# Altium footprint library 4.49-接插件.PcbLib: 260 footprints (part 1 of 17)
Each footprint in its own frame and in the unit in brackets; x right, y up, seen from the top. Pads: shape width x height; smd on the part's side, far side on the other; paste and mask are expansions set on the pad; w line width, h text height; cw(c..) or ccw(c..) is an arc to the next point about the centre after c.
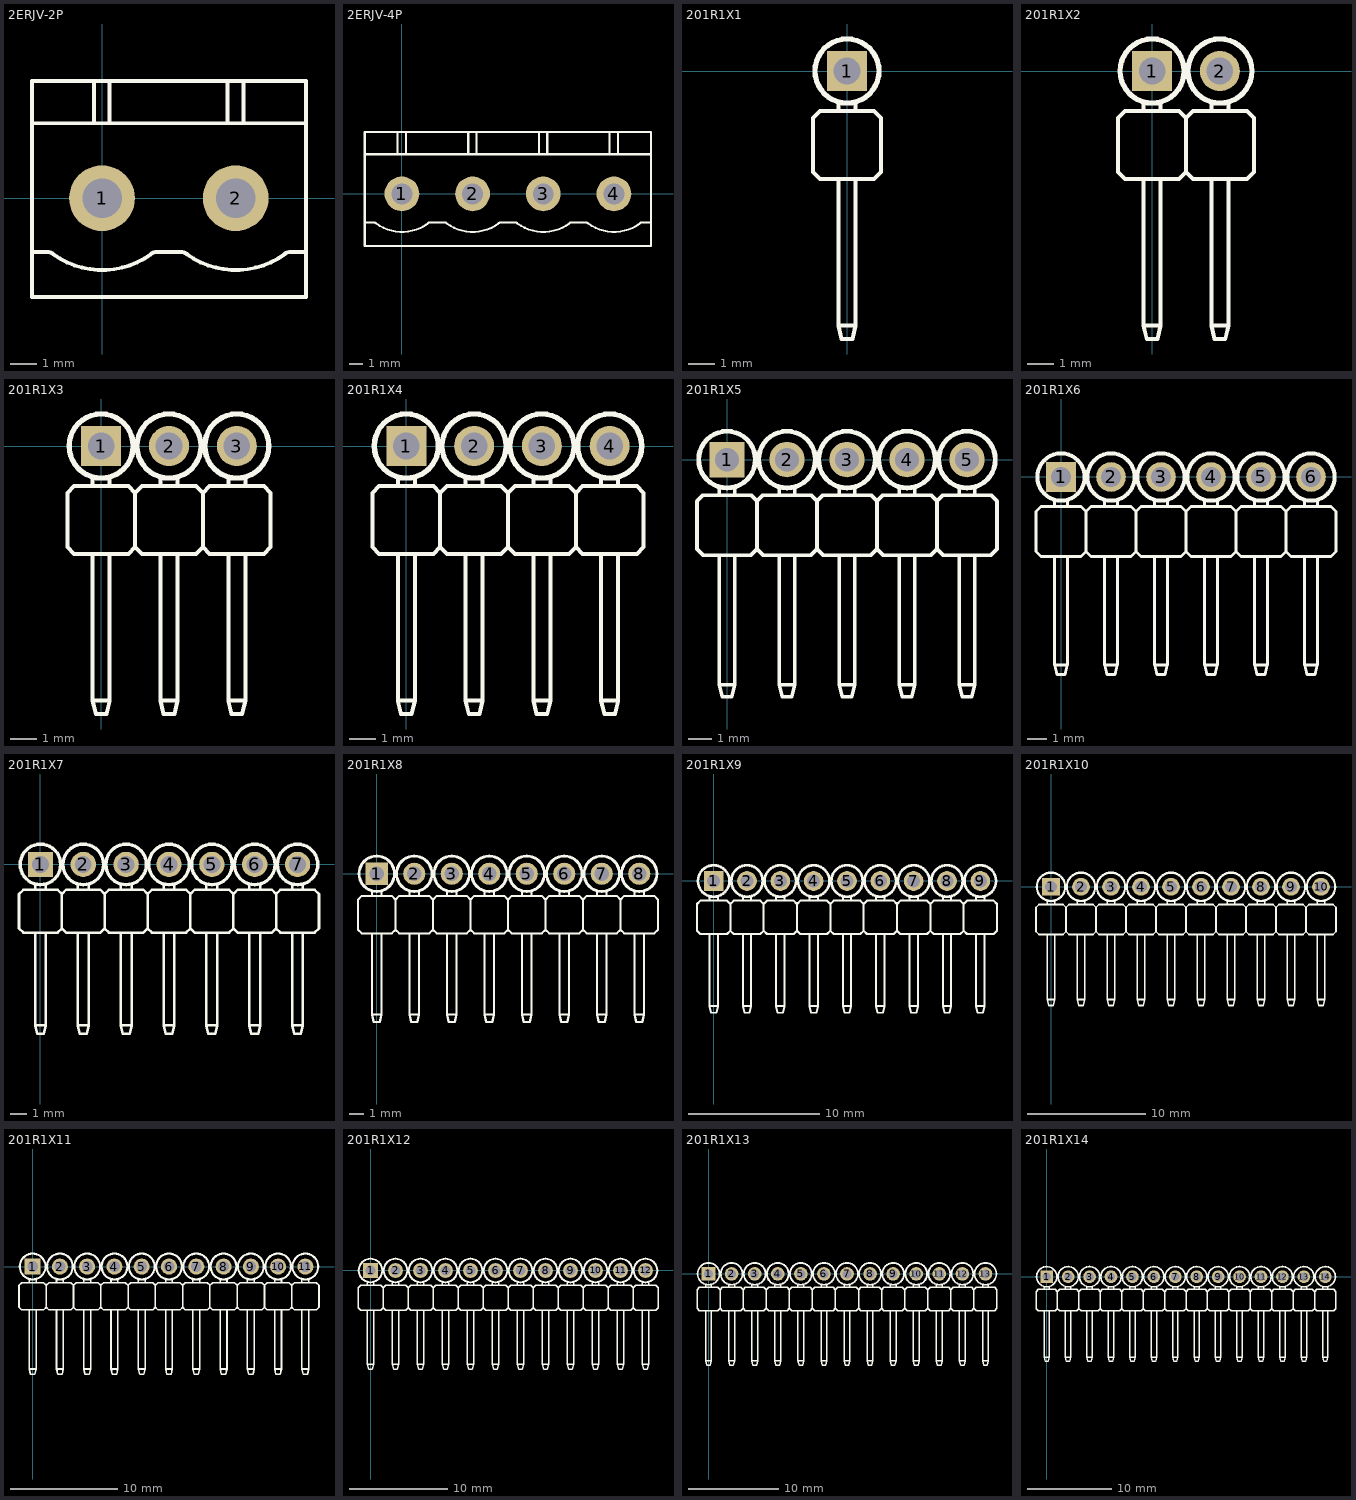
[diagram p0: the footprints below, top view; thin cyan lines are the x and y axes]

## 2ERJV-2P [mm] "淘宝ID:黄晶宝石"
pads (2):
  round 2.5 hole 1.5: 1(0,0) 2(5.08,0)
Top Overlay:
  lines w0.15: -2.67,-2.078 -2.67,-2.05 -2.04,-2.05 cw(c-2.04,-2.308) -1.857,-2.126 ccw(c0.005,0.429) 1.861,-2.131 ; -2.67,2.85 7.75,2.85 ; -0.311,2.85 -0.311,4.45 ; 0.289,2.85 0.289,4.412 ; 1.857,-2.126 cw(c2.04,-2.308) 2.04,-2.05 3.04,-2.05 cw(c3.04,-2.308) 3.223,-2.126 ccw(c5.085,0.429) 6.941,-2.131 ; 4.769,2.85 4.769,4.45 ; 5.369,2.85 5.369,4.412 ; 6.937,-2.126 cw(c7.12,-2.308) 7.12,-2.05 7.745,-2.05 ; -2.67,-3.75 7.75,-3.75 7.75,4.45 -2.67,4.45 -2.67,-3.75
3D body "User Library-konektor sauro 2pm.step": height 12, standoff -4.5, extent -3.015,-3.619 7.485,4.323

## 2ERJV-4P [mm] "淘宝ID:黄晶宝石"
pads (4):
  round 2.5 hole 1.5: 1(0,0) 2(5.08,0) 3(10.16,0) 4(15.24,0)
Top Overlay:
  lines w0.15: -2.67,-2.078 -2.67,-2.05 -2.04,-2.05 cw(c-2.04,-2.308) -1.857,-2.126 ccw(c0.005,0.429) 1.861,-2.131 ; -2.67,2.85 17.91,2.85 ; -0.311,2.85 -0.311,4.45 ; 0.289,2.85 0.289,4.412 ; 1.857,-2.126 cw(c2.04,-2.308) 2.04,-2.05 3.04,-2.05 cw(c3.04,-2.308) 3.223,-2.126 ccw(c5.085,0.429) 6.941,-2.131 ; 4.769,2.85 4.769,4.45 ; 5.369,2.85 5.369,4.412 ; 6.937,-2.126 cw(c7.12,-2.308) 7.12,-2.05 8.12,-2.05 cw(c8.12,-2.308) 8.303,-2.126 ccw(c10.165,0.429) 12.021,-2.131 ; 9.849,2.85 9.849,4.45 ; 10.449,2.85 10.449,4.412 ; 12.017,-2.126 cw(c12.2,-2.308) 12.2,-2.05 13.2,-2.05 cw(c13.2,-2.308) 13.383,-2.126 ccw(c15.245,0.429) 17.101,-2.131 ; 14.929,2.85 14.929,4.45 ; 15.529,2.85 15.529,4.412 ; 17.097,-2.126 cw(c17.28,-2.308) 17.28,-2.05 17.91,-2.05 ; -2.67,-3.75 17.91,-3.75 17.91,4.45 -2.67,4.45 -2.67,-3.75
3D body "User Library-konektor sauro 2pm.step": height 12, standoff -4.5, extent 7.145,-3.619 17.645,4.323
3D body "User Library-konektor sauro 2pm.step": height 12, standoff -4.5, extent -3.015,-3.619 7.485,4.323

## 201R1X1 [mm] "淘宝ID:黄晶宝石"
pads (1):
  rect 1.5x1.5 hole 1: 1(0,0)
Top Overlay:
  circle w0.2: c0,0 r1.2
  lines w0.15: -0.32,-4.05 -0.32,-9.54 ; -0.32,-1.5 -0.32,-1.27 ; 0.32,-4.05 0.32,-9.54 ; 0.32,-1.5 0.32,-1.27 ; -0.32,-9.54 -0.2,-10.04 0.2,-10.04 0.32,-9.54 ; -0.32,-9.54 0.32,-9.54 ; -1.27,-3.786 -1.27,-1.754 -1.016,-1.5 1.016,-1.5 1.27,-1.754 1.27,-3.786 1.016,-4.04 -1.016,-4.04 -1.27,-3.786
3D body "201R1.STEP": height 2.54, standoff -1.73, extent -1.27,-10 1.27,0.315

## 201R1X2 [mm] "淘宝ID:黄晶宝石"
pads (2):
  rect 1.5x1.5 hole 1: 1(0,0)
  round 1.5 hole 1: 2(2.54,0)
Top Overlay:
  circle w0.2: c0,0 r1.2
  circle w0.2: c2.54,0 r1.2
  lines w0.15: -0.32,-4.05 -0.32,-9.54 ; -0.32,-1.5 -0.32,-1.27 ; 0.32,-4.05 0.32,-9.54 ; 0.32,-1.5 0.32,-1.27 ; 2.22,-4.05 2.22,-9.54 ; 2.22,-1.5 2.22,-1.27 ; 2.86,-4.05 2.86,-9.54 ; 2.86,-1.5 2.86,-1.27 ; -0.32,-9.54 0.32,-9.54 ; -0.32,-9.54 -0.2,-10.04 0.2,-10.04 0.32,-9.54 ; 1.27,-3.786 1.016,-4.04 -1.016,-4.04 -1.27,-3.786 -1.27,-1.754 -1.016,-1.5 1.016,-1.5 1.27,-1.754 ; 1.27,-3.786 1.27,-1.754 ; 1.27,-3.786 1.524,-4.04 3.556,-4.04 3.81,-3.786 3.81,-1.754 3.556,-1.5 1.524,-1.5 1.27,-1.754 ; 2.22,-9.54 2.34,-10.04 2.74,-10.04 2.86,-9.54 ; 2.22,-9.54 2.86,-9.54
3D body "201R2.STEP": height 2.54, standoff -1.73, extent -1.27,-10 3.81,0.315

## 201R1X3 [mm] "淘宝ID:黄晶宝石"
pads (3):
  rect 1.5x1.5 hole 1: 1(0,0)
  round 1.5 hole 1: 2(2.54,0) 3(5.08,0)
Top Overlay:
  circle w0.2: c5.08,0 r1.2
  circle w0.2: c0,0 r1.2
  circle w0.2: c2.54,0 r1.2
  lines w0.15: -0.32,-4.05 -0.32,-9.54 ; -0.32,-1.5 -0.32,-1.27 ; 0.32,-4.05 0.32,-9.54 ; 0.32,-1.5 0.32,-1.27 ; 2.22,-4.05 2.22,-9.54 ; 2.22,-1.5 2.22,-1.27 ; 2.86,-4.05 2.86,-9.54 ; 2.86,-1.5 2.86,-1.27 ; 4.76,-4.05 4.76,-9.54 ; 4.76,-1.5 4.76,-1.27 ; 5.4,-4.05 5.4,-9.54 ; 5.4,-1.5 5.4,-1.27 ; -0.32,-9.54 0.32,-9.54 ; -0.32,-9.54 -0.2,-10.04 0.2,-10.04 0.32,-9.54 ; 1.27,-3.786 1.27,-1.754 ; 1.27,-3.786 1.016,-4.04 -1.016,-4.04 -1.27,-3.786 -1.27,-1.754 -1.016,-1.5 1.016,-1.5 1.27,-1.754 ; 1.27,-3.786 1.524,-4.04 3.556,-4.04 3.81,-3.786 ; 1.27,-1.754 1.524,-1.5 3.556,-1.5 3.81,-1.754 ; 2.22,-9.54 2.34,-10.04 2.74,-10.04 2.86,-9.54 ; 2.22,-9.54 2.86,-9.54 ; 3.81,-3.786 3.81,-1.754 ; 3.81,-3.786 4.064,-4.04 6.096,-4.04 6.35,-3.786 6.35,-1.754 6.096,-1.5 4.064,-1.5 3.81,-1.754 ; 4.76,-9.54 5.4,-9.54 ; 4.76,-9.54 4.88,-10.04 5.28,-10.04 5.4,-9.54
3D body "201R3.STEP": height 2.54, standoff -1.73, extent -1.27,-10 6.35,0.315

## 201R1X4 [mm] "淘宝ID:黄晶宝石"
pads (4):
  rect 1.5x1.5 hole 1: 1(0,0)
  round 1.5 hole 1: 2(2.54,0) 3(5.08,0) 4(7.62,0)
Top Overlay:
  circle w0.2: c7.62,0 r1.2
  circle w0.2: c2.54,0 r1.2
  circle w0.2: c0,0 r1.2
  circle w0.2: c5.08,0 r1.2
  lines w0.15: -0.32,-4.05 -0.32,-9.54 ; -0.32,-1.5 -0.32,-1.27 ; 0.32,-4.05 0.32,-9.54 ; 0.32,-1.5 0.32,-1.27 ; 2.22,-4.05 2.22,-9.54 ; 2.22,-1.5 2.22,-1.27 ; 2.86,-4.05 2.86,-9.54 ; 2.86,-1.5 2.86,-1.27 ; 4.76,-4.05 4.76,-9.54 ; 4.76,-1.5 4.76,-1.27 ; 5.4,-4.05 5.4,-9.54 ; 5.4,-1.5 5.4,-1.27 ; 7.3,-4.05 7.3,-9.54 ; 7.3,-1.5 7.3,-1.27 ; 7.94,-4.05 7.94,-9.54 ; 7.94,-1.5 7.94,-1.27 ; -0.32,-9.54 -0.2,-10.04 0.2,-10.04 0.32,-9.54 ; -0.32,-9.54 0.32,-9.54 ; 1.27,-3.786 1.524,-4.04 3.556,-4.04 3.81,-3.786 ; 1.27,-3.786 1.27,-1.754 ; 1.27,-3.786 1.016,-4.04 -1.016,-4.04 -1.27,-3.786 -1.27,-1.754 -1.016,-1.5 1.016,-1.5 1.27,-1.754 ; 1.27,-1.754 1.524,-1.5 3.556,-1.5 3.81,-1.754 ; 2.22,-9.54 2.86,-9.54 ; 2.22,-9.54 2.34,-10.04 2.74,-10.04 2.86,-9.54 ; 3.81,-3.786 3.81,-1.754 ; 3.81,-3.786 4.064,-4.04 6.096,-4.04 6.35,-3.786 ; 3.81,-1.754 4.064,-1.5 6.096,-1.5 6.35,-1.754 ; 4.76,-9.54 4.88,-10.04 5.28,-10.04 5.4,-9.54 ; 4.76,-9.54 5.4,-9.54 ; 6.35,-3.786 6.604,-4.04 8.636,-4.04 8.89,-3.786 8.89,-1.754 8.636,-1.5 6.604,-1.5 6.35,-1.754 ; 6.35,-3.786 6.35,-1.754 ; 7.3,-9.54 7.94,-9.54 ; 7.3,-9.54 7.42,-10.04 7.82,-10.04 7.94,-9.54
3D body "201R4.STEP": height 2.54, standoff -1.73, extent -1.27,-10 8.89,0.315

## 201R1X5 [mm] "淘宝ID:黄晶宝石"
pads (5):
  rect 1.5x1.5 hole 1: 1(0,0)
  round 1.5 hole 1: 2(2.54,0) 3(5.08,0) 4(7.62,0) 5(10.16,0)
Top Overlay:
  circle w0.2: c7.62,0 r1.2
  circle w0.2: c2.54,0 r1.2
  circle w0.2: c0,0 r1.2
  circle w0.2: c5.08,0 r1.2
  circle w0.2: c10.16,0 r1.2
  lines w0.15: -0.32,-4.05 -0.32,-9.54 ; -0.32,-1.5 -0.32,-1.27 ; 0.32,-4.05 0.32,-9.54 ; 0.32,-1.5 0.32,-1.27 ; 2.22,-4.05 2.22,-9.54 ; 2.22,-1.5 2.22,-1.27 ; 2.86,-4.05 2.86,-9.54 ; 2.86,-1.5 2.86,-1.27 ; 4.76,-4.05 4.76,-9.54 ; 4.76,-1.5 4.76,-1.27 ; 5.4,-4.05 5.4,-9.54 ; 5.4,-1.5 5.4,-1.27 ; 7.3,-4.05 7.3,-9.54 ; 7.3,-1.5 7.3,-1.27 ; 7.94,-4.05 7.94,-9.54 ; 7.94,-1.5 7.94,-1.27 ; 9.84,-4.05 9.84,-9.54 ; 9.84,-1.5 9.84,-1.27 ; 10.48,-4.05 10.48,-9.54 ; 10.48,-1.5 10.48,-1.27 ; -0.32,-9.54 -0.2,-10.04 0.2,-10.04 0.32,-9.54 ; -0.32,-9.54 0.32,-9.54 ; 1.27,-3.786 1.524,-4.04 3.556,-4.04 3.81,-3.786 ; 1.27,-3.786 1.27,-1.754 ; 1.27,-3.786 1.016,-4.04 -1.016,-4.04 -1.27,-3.786 -1.27,-1.754 -1.016,-1.5 1.016,-1.5 1.27,-1.754 ; 1.27,-1.754 1.524,-1.5 3.556,-1.5 3.81,-1.754 ; 2.22,-9.54 2.86,-9.54 ; 2.22,-9.54 2.34,-10.04 2.74,-10.04 2.86,-9.54 ; 3.81,-3.786 3.81,-1.754 ; 3.81,-3.786 4.064,-4.04 6.096,-4.04 6.35,-3.786 ; 3.81,-1.754 4.064,-1.5 6.096,-1.5 6.35,-1.754 ; 4.76,-9.54 4.88,-10.04 5.28,-10.04 5.4,-9.54 ; 4.76,-9.54 5.4,-9.54 ; 6.35,-3.786 6.604,-4.04 8.636,-4.04 8.89,-3.786 ; 6.35,-3.786 6.35,-1.754 ; 6.35,-1.754 6.604,-1.5 8.636,-1.5 8.89,-1.754 ; 7.3,-9.54 7.94,-9.54 ; 7.3,-9.54 7.42,-10.04 7.82,-10.04 7.94,-9.54 ; 8.89,-3.786 8.89,-1.754 ; 8.89,-3.786 9.144,-4.04 11.176,-4.04 11.43,-3.786 11.43,-1.754 11.176,-1.5 9.144,-1.5 8.89,-1.754 ; 9.84,-9.54 9.96,-10.04 10.36,-10.04 10.48,-9.54 ; 9.84,-9.54 10.48,-9.54
3D body "201R5.STEP": height 2.54, standoff -1.73, extent -1.27,-10 11.43,0.315

## 201R1X6 [mm] "淘宝ID:黄晶宝石"
pads (6):
  rect 1.5x1.5 hole 1: 1(0,0)
  round 1.5 hole 1: 2(2.54,0) 3(5.08,0) 4(7.62,0) 5(10.16,0) 6(12.7,0)
Top Overlay:
  circle w0.2: c12.7,0 r1.2
  circle w0.2: c10.16,0 r1.2
  circle w0.2: c5.08,0 r1.2
  circle w0.2: c0,0 r1.2
  circle w0.2: c2.54,0 r1.2
  circle w0.2: c7.62,0 r1.2
  lines w0.15: -0.32,-4.05 -0.32,-9.54 ; -0.32,-1.5 -0.32,-1.27 ; 0.32,-4.05 0.32,-9.54 ; 0.32,-1.5 0.32,-1.27 ; 2.22,-4.05 2.22,-9.54 ; 2.22,-1.5 2.22,-1.27 ; 2.86,-4.05 2.86,-9.54 ; 2.86,-1.5 2.86,-1.27 ; 4.76,-4.05 4.76,-9.54 ; 4.76,-1.5 4.76,-1.27 ; 5.4,-4.05 5.4,-9.54 ; 5.4,-1.5 5.4,-1.27 ; 7.3,-4.05 7.3,-9.54 ; 7.3,-1.5 7.3,-1.27 ; 7.94,-4.05 7.94,-9.54 ; 7.94,-1.5 7.94,-1.27 ; 9.84,-4.05 9.84,-9.54 ; 9.84,-1.5 9.84,-1.27 ; 10.48,-4.05 10.48,-9.54 ; 10.48,-1.5 10.48,-1.27 ; 12.38,-4.05 12.38,-9.54 ; 12.38,-1.5 12.38,-1.27 ; 13.02,-4.05 13.02,-9.54 ; 13.02,-1.5 13.02,-1.27 ; -0.32,-9.54 0.32,-9.54 ; -0.32,-9.54 -0.2,-10.04 0.2,-10.04 0.32,-9.54 ; 1.27,-3.786 1.016,-4.04 -1.016,-4.04 -1.27,-3.786 -1.27,-1.754 -1.016,-1.5 1.016,-1.5 1.27,-1.754 ; 1.27,-3.786 1.27,-1.754 ; 1.27,-3.786 1.524,-4.04 3.556,-4.04 3.81,-3.786 ; 1.27,-1.754 1.524,-1.5 3.556,-1.5 3.81,-1.754 ; 2.22,-9.54 2.34,-10.04 2.74,-10.04 2.86,-9.54 ; 2.22,-9.54 2.86,-9.54 ; 3.81,-3.786 4.064,-4.04 6.096,-4.04 6.35,-3.786 ; 3.81,-3.786 3.81,-1.754 ; 3.81,-1.754 4.064,-1.5 6.096,-1.5 6.35,-1.754 ; 4.76,-9.54 5.4,-9.54 ; 4.76,-9.54 4.88,-10.04 5.28,-10.04 5.4,-9.54 ; 6.35,-3.786 6.35,-1.754 ; 6.35,-3.786 6.604,-4.04 8.636,-4.04 8.89,-3.786 ; 6.35,-1.754 6.604,-1.5 8.636,-1.5 8.89,-1.754 ; 7.3,-9.54 7.42,-10.04 7.82,-10.04 7.94,-9.54 ; 7.3,-9.54 7.94,-9.54 ; 8.89,-3.786 9.144,-4.04 11.176,-4.04 11.43,-3.786 ; 8.89,-3.786 8.89,-1.754 ; 8.89,-1.754 9.144,-1.5 11.176,-1.5 11.43,-1.754 ; 9.84,-9.54 10.48,-9.54 ; 9.84,-9.54 9.96,-10.04 10.36,-10.04 10.48,-9.54 ; 11.43,-3.786 11.43,-1.754 ; 11.43,-3.786 11.684,-4.04 13.716,-4.04 13.97,-3.786 13.97,-1.754 13.716,-1.5 11.684,-1.5 11.43,-1.754 ; 12.38,-9.54 12.5,-10.04 12.9,-10.04 13.02,-9.54 ; 12.38,-9.54 13.02,-9.54
3D body "201R6.STEP": height 2.54, standoff -1.73, extent -1.27,-10 13.97,0.315

## 201R1X7 [mm] "淘宝ID:黄晶宝石"
pads (7):
  rect 1.5x1.5 hole 1: 1(0,0)
  round 1.5 hole 1: 2(2.54,0) 3(5.08,0) 4(7.62,0) 5(10.16,0) 6(12.7,0) 7(15.24,0)
Top Overlay:
  circle w0.2: c15.24,0 r1.2
  circle w0.2: c12.7,0 r1.2
  circle w0.2: c10.16,0 r1.2
  circle w0.2: c5.08,0 r1.2
  circle w0.2: c0,0 r1.2
  circle w0.2: c2.54,0 r1.2
  circle w0.2: c7.62,0 r1.2
  lines w0.15: -0.32,-4.05 -0.32,-9.54 ; -0.32,-1.5 -0.32,-1.27 ; 0.32,-4.05 0.32,-9.54 ; 0.32,-1.5 0.32,-1.27 ; 2.22,-4.05 2.22,-9.54 ; 2.22,-1.5 2.22,-1.27 ; 2.86,-4.05 2.86,-9.54 ; 2.86,-1.5 2.86,-1.27 ; 4.76,-4.05 4.76,-9.54 ; 4.76,-1.5 4.76,-1.27 ; 5.4,-4.05 5.4,-9.54 ; 5.4,-1.5 5.4,-1.27 ; 7.3,-4.05 7.3,-9.54 ; 7.3,-1.5 7.3,-1.27 ; 7.94,-4.05 7.94,-9.54 ; 7.94,-1.5 7.94,-1.27 ; 9.84,-4.05 9.84,-9.54 ; 9.84,-1.5 9.84,-1.27 ; 10.48,-4.05 10.48,-9.54 ; 10.48,-1.5 10.48,-1.27 ; 12.38,-4.05 12.38,-9.54 ; 12.38,-1.5 12.38,-1.27 ; 13.02,-4.05 13.02,-9.54 ; 13.02,-1.5 13.02,-1.27 ; 14.92,-4.05 14.92,-9.54 ; 14.92,-1.5 14.92,-1.27 ; 15.56,-4.05 15.56,-9.54 ; 15.56,-1.5 15.56,-1.27 ; -0.32,-9.54 0.32,-9.54 ; -0.32,-9.54 -0.2,-10.04 0.2,-10.04 0.32,-9.54 ; 1.27,-3.786 1.27,-1.754 ; 1.27,-3.786 1.016,-4.04 -1.016,-4.04 -1.27,-3.786 -1.27,-1.754 -1.016,-1.5 1.016,-1.5 1.27,-1.754 ; 1.27,-3.786 1.524,-4.04 3.556,-4.04 3.81,-3.786 ; 1.27,-1.754 1.524,-1.5 3.556,-1.5 3.81,-1.754 ; 2.22,-9.54 2.34,-10.04 2.74,-10.04 2.86,-9.54 ; 2.22,-9.54 2.86,-9.54 ; 3.81,-3.786 3.81,-1.754 ; 3.81,-3.786 4.064,-4.04 6.096,-4.04 6.35,-3.786 ; 3.81,-1.754 4.064,-1.5 6.096,-1.5 6.35,-1.754 ; 4.76,-9.54 5.4,-9.54 ; 4.76,-9.54 4.88,-10.04 5.28,-10.04 5.4,-9.54 ; 6.35,-3.786 6.35,-1.754 ; 6.35,-3.786 6.604,-4.04 8.636,-4.04 8.89,-3.786 ; 6.35,-1.754 6.604,-1.5 8.636,-1.5 8.89,-1.754 ; 7.3,-9.54 7.42,-10.04 7.82,-10.04 7.94,-9.54 ; 7.3,-9.54 7.94,-9.54 ; 8.89,-3.786 8.89,-1.754 ; 8.89,-3.786 9.144,-4.04 11.176,-4.04 11.43,-3.786 ; 8.89,-1.754 9.144,-1.5 11.176,-1.5 11.43,-1.754 ; 9.84,-9.54 10.48,-9.54 ; 9.84,-9.54 9.96,-10.04 10.36,-10.04 10.48,-9.54 ; 11.43,-3.786 11.43,-1.754 ; 11.43,-3.786 11.684,-4.04 13.716,-4.04 13.97,-3.786 ; 11.43,-1.754 11.684,-1.5 13.716,-1.5 13.97,-1.754 ; 12.38,-9.54 12.5,-10.04 12.9,-10.04 13.02,-9.54 ; 12.38,-9.54 13.02,-9.54 ; 13.97,-3.786 13.97,-1.754 ; 13.97,-3.786 14.224,-4.04 16.256,-4.04 16.51,-3.786 16.51,-1.754 16.256,-1.5 14.224,-1.5 13.97,-1.754 ; 14.92,-9.54 15.56,-9.54 ; 14.92,-9.54 15.04,-10.04 15.44,-10.04 15.56,-9.54
3D body "201R7.STEP": height 2.54, standoff -1.73, extent -1.27,-10 16.51,0.315

## 201R1X8 [mm] "淘宝ID:黄晶宝石"
pads (8):
  rect 1.5x1.5 hole 1: 1(0,0)
  round 1.5 hole 1: 2(2.54,0) 3(5.08,0) 4(7.62,0) 5(10.16,0) 6(12.7,0) 7(15.24,0) 8(17.78,0)
Top Overlay:
  circle w0.2: c15.24,0 r1.2
  circle w0.2: c12.7,0 r1.2
  circle w0.2: c10.16,0 r1.2
  circle w0.2: c5.08,0 r1.2
  circle w0.2: c0,0 r1.2
  circle w0.2: c2.54,0 r1.2
  circle w0.2: c7.62,0 r1.2
  circle w0.2: c17.78,0 r1.2
  lines w0.15: -0.32,-4.05 -0.32,-9.54 ; -0.32,-1.5 -0.32,-1.27 ; 0.32,-4.05 0.32,-9.54 ; 0.32,-1.5 0.32,-1.27 ; 2.22,-4.05 2.22,-9.54 ; 2.22,-1.5 2.22,-1.27 ; 2.86,-4.05 2.86,-9.54 ; 2.86,-1.5 2.86,-1.27 ; 4.76,-4.05 4.76,-9.54 ; 4.76,-1.5 4.76,-1.27 ; 5.4,-4.05 5.4,-9.54 ; 5.4,-1.5 5.4,-1.27 ; 7.3,-4.05 7.3,-9.54 ; 7.3,-1.5 7.3,-1.27 ; 7.94,-4.05 7.94,-9.54 ; 7.94,-1.5 7.94,-1.27 ; 9.84,-4.05 9.84,-9.54 ; 9.84,-1.5 9.84,-1.27 ; 10.48,-4.05 10.48,-9.54 ; 10.48,-1.5 10.48,-1.27 ; 12.38,-4.05 12.38,-9.54 ; 12.38,-1.5 12.38,-1.27 ; 13.02,-4.05 13.02,-9.54 ; 13.02,-1.5 13.02,-1.27 ; 14.92,-4.05 14.92,-9.54 ; 14.92,-1.5 14.92,-1.27 ; 15.56,-4.05 15.56,-9.54 ; 15.56,-1.5 15.56,-1.27 ; 17.46,-4.05 17.46,-9.54 ; 17.46,-1.5 17.46,-1.27 ; 18.1,-4.05 18.1,-9.54 ; 18.1,-1.5 18.1,-1.27 ; -0.32,-9.54 0.32,-9.54 ; -0.32,-9.54 -0.2,-10.04 0.2,-10.04 0.32,-9.54 ; 1.27,-3.786 1.27,-1.754 ; 1.27,-3.786 1.016,-4.04 -1.016,-4.04 -1.27,-3.786 -1.27,-1.754 -1.016,-1.5 1.016,-1.5 1.27,-1.754 ; 1.27,-3.786 1.524,-4.04 3.556,-4.04 3.81,-3.786 ; 1.27,-1.754 1.524,-1.5 3.556,-1.5 3.81,-1.754 ; 2.22,-9.54 2.34,-10.04 2.74,-10.04 2.86,-9.54 ; 2.22,-9.54 2.86,-9.54 ; 3.81,-3.786 3.81,-1.754 ; 3.81,-3.786 4.064,-4.04 6.096,-4.04 6.35,-3.786 ; 3.81,-1.754 4.064,-1.5 6.096,-1.5 6.35,-1.754 ; 4.76,-9.54 5.4,-9.54 ; 4.76,-9.54 4.88,-10.04 5.28,-10.04 5.4,-9.54 ; 6.35,-3.786 6.35,-1.754 ; 6.35,-3.786 6.604,-4.04 8.636,-4.04 8.89,-3.786 ; 6.35,-1.754 6.604,-1.5 8.636,-1.5 8.89,-1.754 ; 7.3,-9.54 7.42,-10.04 7.82,-10.04 7.94,-9.54 ; 7.3,-9.54 7.94,-9.54 ; 8.89,-3.786 8.89,-1.754 ; 8.89,-3.786 9.144,-4.04 11.176,-4.04 11.43,-3.786 ; 8.89,-1.754 9.144,-1.5 11.176,-1.5 11.43,-1.754 ; 9.84,-9.54 10.48,-9.54 ; 9.84,-9.54 9.96,-10.04 10.36,-10.04 10.48,-9.54 ; 11.43,-3.786 11.43,-1.754 ; 11.43,-3.786 11.684,-4.04 13.716,-4.04 13.97,-3.786 ; 11.43,-1.754 11.684,-1.5 13.716,-1.5 13.97,-1.754 ; 12.38,-9.54 12.5,-10.04 12.9,-10.04 13.02,-9.54 ; 12.38,-9.54 13.02,-9.54 ; 13.97,-3.786 13.97,-1.754 ; 13.97,-3.786 14.224,-4.04 16.256,-4.04 16.51,-3.786 ; 13.97,-1.754 14.224,-1.5 16.256,-1.5 16.51,-1.754 ; 14.92,-9.54 15.56,-9.54 ; 14.92,-9.54 15.04,-10.04 15.44,-10.04 15.56,-9.54 ; 16.51,-3.786 16.764,-4.04 18.796,-4.04 19.05,-3.786 19.05,-1.754 18.796,-1.5 16.764,-1.5 16.51,-1.754 ; 16.51,-3.786 16.51,-1.754 ; 17.46,-9.54 17.58,-10.04 17.98,-10.04 18.1,-9.54 ; 17.46,-9.54 18.1,-9.54
3D body "201R8.STEP": height 2.54, standoff -1.73, extent -1.27,-10 19.05,0.315

## 201R1X9 [mm] "淘宝ID:黄晶宝石"
pads (9):
  rect 1.5x1.5 hole 1: 1(0,0)
  round 1.5 hole 1: 2(2.54,0) 3(5.08,0) 4(7.62,0) 5(10.16,0) 6(12.7,0) 7(15.24,0) 8(17.78,0) 9(20.32,0)
Top Overlay:
  circle w0.2: c15.24,0 r1.2
  circle w0.2: c12.7,0 r1.2
  circle w0.2: c10.16,0 r1.2
  circle w0.2: c5.08,0 r1.2
  circle w0.2: c0,0 r1.2
  circle w0.2: c2.54,0 r1.2
  circle w0.2: c7.62,0 r1.2
  circle w0.2: c17.78,0 r1.2
  circle w0.2: c20.32,0 r1.2
  lines w0.15: -0.32,-4.05 -0.32,-9.54 ; -0.32,-1.5 -0.32,-1.27 ; 0.32,-4.05 0.32,-9.54 ; 0.32,-1.5 0.32,-1.27 ; 2.22,-4.05 2.22,-9.54 ; 2.22,-1.5 2.22,-1.27 ; 2.86,-4.05 2.86,-9.54 ; 2.86,-1.5 2.86,-1.27 ; 4.76,-4.05 4.76,-9.54 ; 4.76,-1.5 4.76,-1.27 ; 5.4,-4.05 5.4,-9.54 ; 5.4,-1.5 5.4,-1.27 ; 7.3,-4.05 7.3,-9.54 ; 7.3,-1.5 7.3,-1.27 ; 7.94,-4.05 7.94,-9.54 ; 7.94,-1.5 7.94,-1.27 ; 9.84,-4.05 9.84,-9.54 ; 9.84,-1.5 9.84,-1.27 ; 10.48,-4.05 10.48,-9.54 ; 10.48,-1.5 10.48,-1.27 ; 12.38,-4.05 12.38,-9.54 ; 12.38,-1.5 12.38,-1.27 ; 13.02,-4.05 13.02,-9.54 ; 13.02,-1.5 13.02,-1.27 ; 14.92,-4.05 14.92,-9.54 ; 14.92,-1.5 14.92,-1.27 ; 15.56,-4.05 15.56,-9.54 ; 15.56,-1.5 15.56,-1.27 ; 17.46,-4.05 17.46,-9.54 ; 17.46,-1.5 17.46,-1.27 ; 18.1,-4.05 18.1,-9.54 ; 18.1,-1.5 18.1,-1.27 ; 20,-4.05 20,-9.54 ; 20,-1.5 20,-1.27 ; 20.64,-4.05 20.64,-9.54 ; 20.64,-1.5 20.64,-1.27 ; -0.32,-9.54 0.32,-9.54 ; -0.32,-9.54 -0.2,-10.04 0.2,-10.04 0.32,-9.54 ; 1.27,-3.786 1.27,-1.754 ; 1.27,-3.786 1.016,-4.04 -1.016,-4.04 -1.27,-3.786 -1.27,-1.754 -1.016,-1.5 1.016,-1.5 1.27,-1.754 ; 1.27,-3.786 1.524,-4.04 3.556,-4.04 3.81,-3.786 ; 1.27,-1.754 1.524,-1.5 3.556,-1.5 3.81,-1.754 ; 2.22,-9.54 2.34,-10.04 2.74,-10.04 2.86,-9.54 ; 2.22,-9.54 2.86,-9.54 ; 3.81,-3.786 3.81,-1.754 ; 3.81,-3.786 4.064,-4.04 6.096,-4.04 6.35,-3.786 ; 3.81,-1.754 4.064,-1.5 6.096,-1.5 6.35,-1.754 ; 4.76,-9.54 5.4,-9.54 ; 4.76,-9.54 4.88,-10.04 5.28,-10.04 5.4,-9.54 ; 6.35,-3.786 6.35,-1.754 ; 6.35,-3.786 6.604,-4.04 8.636,-4.04 8.89,-3.786 ; 6.35,-1.754 6.604,-1.5 8.636,-1.5 8.89,-1.754 ; 7.3,-9.54 7.42,-10.04 7.82,-10.04 7.94,-9.54 ; 7.3,-9.54 7.94,-9.54 ; 8.89,-3.786 8.89,-1.754 ; 8.89,-3.786 9.144,-4.04 11.176,-4.04 11.43,-3.786 ; 8.89,-1.754 9.144,-1.5 11.176,-1.5 11.43,-1.754 ; 9.84,-9.54 10.48,-9.54 ; 9.84,-9.54 9.96,-10.04 10.36,-10.04 10.48,-9.54 ; 11.43,-3.786 11.43,-1.754 ; 11.43,-3.786 11.684,-4.04 13.716,-4.04 13.97,-3.786 ; 11.43,-1.754 11.684,-1.5 13.716,-1.5 13.97,-1.754 ; 12.38,-9.54 12.5,-10.04 12.9,-10.04 13.02,-9.54 ; 12.38,-9.54 13.02,-9.54 ; 13.97,-3.786 13.97,-1.754 ; 13.97,-3.786 14.224,-4.04 16.256,-4.04 16.51,-3.786 ; 13.97,-1.754 14.224,-1.5 16.256,-1.5 16.51,-1.754 ; 14.92,-9.54 15.56,-9.54 ; 14.92,-9.54 15.04,-10.04 15.44,-10.04 15.56,-9.54 ; 16.51,-3.786 16.764,-4.04 18.796,-4.04 19.05,-3.786 ; 16.51,-3.786 16.51,-1.754 ; 16.51,-1.754 16.764,-1.5 18.796,-1.5 19.05,-1.754 ; 17.46,-9.54 17.58,-10.04 17.98,-10.04 18.1,-9.54 ; 17.46,-9.54 18.1,-9.54 ; 19.05,-3.786 19.05,-1.754 ; 19.05,-3.786 19.304,-4.04 21.336,-4.04 21.59,-3.786 21.59,-1.754 21.336,-1.5 19.304,-1.5 19.05,-1.754 ; 20,-9.54 20.64,-9.54 ; 20,-9.54 20.12,-10.04 20.52,-10.04 20.64,-9.54
3D body "201R9.STEP": height 2.54, standoff -1.73, extent -1.27,-10 21.59,0.315

## 201R1X10 [mm] "淘宝ID:黄晶宝石"
pads (10):
  rect 1.5x1.5 hole 1: 1(0,0)
  round 1.5 hole 1: 2(2.54,0) 3(5.08,0) 4(7.62,0) 5(10.16,0) 6(12.7,0) 7(15.24,0) 8(17.78,0) 9(20.32,0) 10(22.86,0)
Top Overlay:
  drawing of 161 lines, arcs and shapes, not listed
3D body "201R10.STEP": height 2.54, standoff -1.73, extent -1.27,-10 24.13,0.315

## 201R1X11 [mm]
pads (11):
  rect 1.5x1.5 hole 1: 1(0,0)
  round 1.5 hole 1: 2(2.54,0) 3(5.08,0) 4(7.62,0) 5(10.16,0) 6(12.7,0) 7(15.24,0) 8(17.78,0) 9(20.32,0) 10(22.86,0) 11(25.4,0)
Top Overlay:
  drawing of 177 lines, arcs and shapes, not listed
3D body "201R11.STEP": height 2.54, standoff -1.73, extent -1.27,-10 26.67,0.315

## 201R1X12 [mm]
pads (12):
  rect 1.5x1.5 hole 1: 1(0,0)
  round 1.5 hole 1: 2(2.54,0) 3(5.08,0) 4(7.62,0) 5(10.16,0) 6(12.7,0) 7(15.24,0) 8(17.78,0) 9(20.32,0) 10(22.86,0) 11(25.4,0) 12(27.94,0)
Top Overlay:
  drawing of 193 lines, arcs and shapes, not listed
3D body "201R12.STEP": height 2.54, standoff -1.73, extent -1.27,-10 29.21,0.315

## 201R1X13 [mm]
pads (13):
  rect 1.5x1.5 hole 1: 1(0,0)
  round 1.5 hole 1: 2(2.54,0) 3(5.08,0) 4(7.62,0) 5(10.16,0) 6(12.7,0) 7(15.24,0) 8(17.78,0) 9(20.32,0) 10(22.86,0) 11(25.4,0) 12(27.94,0) 13(30.48,0)
Top Overlay:
  drawing of 209 lines, arcs and shapes, not listed
3D body "201R13.STEP": height 2.54, standoff -1.73, extent -1.27,-10 31.75,0.315

## 201R1X14 [mm]
pads (14):
  rect 1.5x1.5 hole 1: 1(0,0)
  round 1.5 hole 1: 2(2.54,0) 3(5.08,0) 4(7.62,0) 5(10.16,0) 6(12.7,0) 7(15.24,0) 8(17.78,0) 9(20.32,0) 10(22.86,0) 11(25.4,0) 12(27.94,0) 13(30.48,0) 14(33.02,0)
Top Overlay:
  drawing of 225 lines, arcs and shapes, not listed
3D body "201R14.STEP": height 2.54, standoff -1.73, extent -1.27,-10 34.29,0.315